# Altium footprint library Tomra_Cadstar_Footprints.PcbLib: 373 footprints (part 4 of 24)
Each footprint in its own frame and in the unit in brackets; x right, y up, seen from the top. Pads: shape width x height; smd on the part's side, far side on the other; paste and mask are expansions set on the pad; w line width, h text height; cw(c..) or ccw(c..) is an arc to the next point about the centre after c.
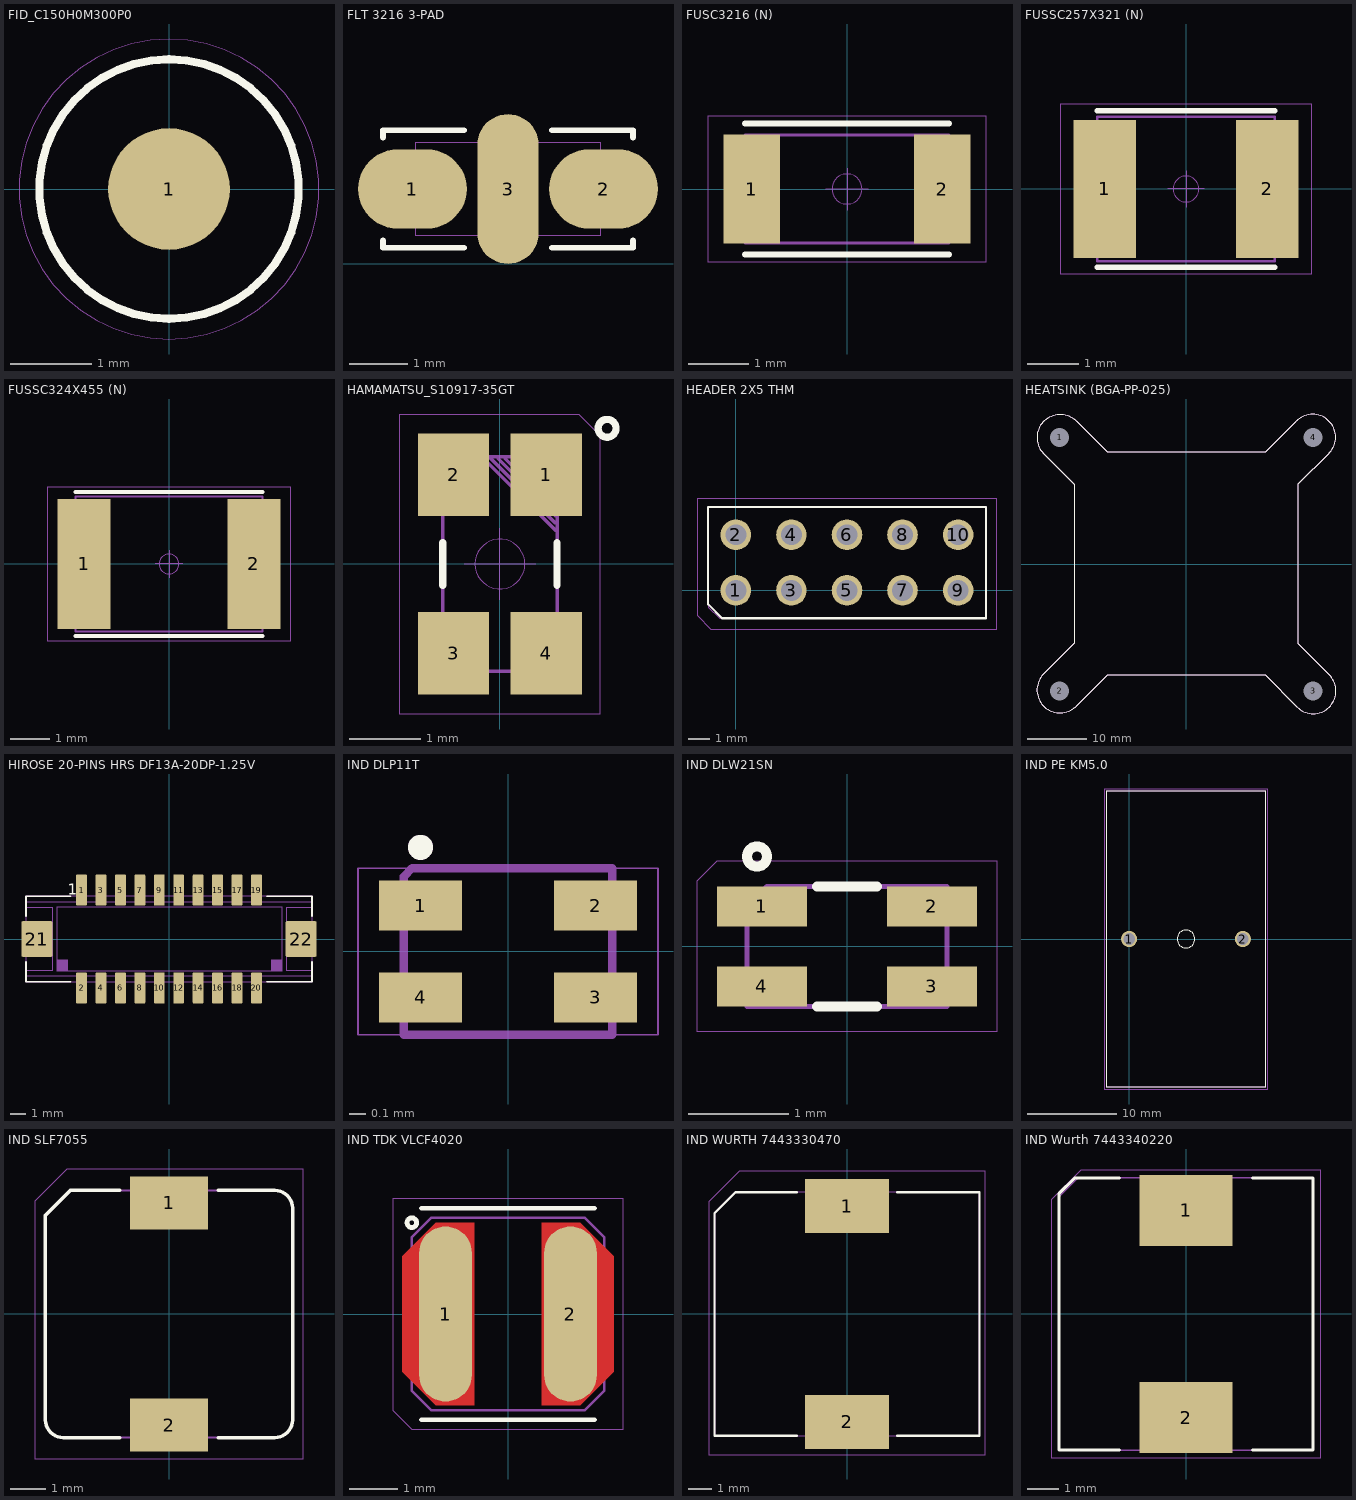
[diagram p3: the footprints below, top view; thin cyan lines are the x and y axes]

## FID_C150H0M300P0 [mm]
pads (1):
  round 1.5 smd paste+0 mask+1.5: 1(0,0)
Top Silk:
  lines w0.1: 0,-1.6 cw(c0,0) 0,1.6 cw(c0,0) 0,-1.6
  text ".Designator" at 0.05,1.85 h0.7
Top Assembly:
  lines w0.05: 0,-1.6 cw(c0,0) 0,1.6 cw(c0,0) 0,-1.6
Top Placement:
  lines w0.01: 0,-1.85 cw(c0,0) 0,1.85 cw(c0,0) 0,-1.85

## FLT 3216 3-PAD [mm]
height 1.6
pads (3):
  oval 1.878x1.37 smd paste+0 mask+0: 1(1.245,1.292) 2(4.547,1.292)
  oval 1.06x2.584 smd paste+0 mask+0: 3(2.896,1.292)
Top Silk:
  lines w0.1: 0.737,0.403 0.737,0.276 2.134,0.276 ; 0.737,2.181 0.737,2.308 2.134,2.308 ; 3.658,0.276 5.055,0.276 5.055,0.403 ; 3.658,2.308 5.055,2.308 5.055,2.181
Top Assembly:
  lines w0.05: 0.737,0.403 0.737,0.276 2.134,0.276 ; 0.737,2.181 0.737,2.308 2.134,2.308 ; 3.658,0.276 5.055,0.276 5.055,0.403 ; 3.658,2.308 5.055,2.308 5.055,2.181
Top Placement:
  lines w0.01: 1.296,0.492 4.496,0.492 4.496,2.092 1.296,2.092 1.296,0.492
  text ".Designator" at -0.703,0.942 h0.7

## FUSC3216 (N) [mm]
height 0.85
pads (2):
  rect 0.94x1.82 smd paste+0 mask+0: 1(-1.59,0) 2(1.59,0)
Top Silk:
  lines w0.1: -1.7,-1.09 1.7,-1.09 ; -1.7,1.09 1.7,1.09
  text ".Designator" at -3.599,-0.35 h0.7
Top Assembly:
  lines w0.05: -1.7,-0.9 -1.7,0.9 1.7,0.9 1.7,-0.9 -1.7,-0.9
Top Placement:
  lines w0.01: -0.35,0 0.35,0 ; 0,-0.35 0,0.35 ; -2.31,-1.22 -2.31,1.22 2.31,1.22 2.31,-1.22 -2.31,-1.22 ; -0.25,0 cw(c0,0) 0.25,0 cw(c0,0) -0.25,0

## FUSSC257X321 (N) [mm]
height 0.85
pads (2):
  rect 1.21x2.67 smd paste+0 mask+0: 1(-1.57,0) 2(1.57,0)
Top Silk:
  lines w0.1: -1.72,-1.515 1.72,-1.515 ; -1.72,1.515 1.72,1.515
  text ".Designator" at -3.599,-0.35 h0.7
Drill:
  lines w0.05: -1.715,-1.4 -1.715,1.4 1.715,1.4 1.715,-1.4 -1.715,-1.4
Top Assembly:
  lines w0.05: -1.72,-1.4 -1.72,1.4 1.72,1.4 1.72,-1.4 -1.72,-1.4
Top Placement:
  lines w0.01: -0.35,0 0.35,0 ; 0,-0.35 0,0.35 ; -2.43,-1.65 -2.43,1.65 2.43,1.65 2.43,-1.65 -2.43,-1.65 ; -0.25,0 cw(c0,0) 0.25,0 cw(c0,0) -0.25,0

## FUSSC324X455 (N) [mm]
height 0.89
pads (2):
  rect 1.34x3.29 smd paste+0 mask+0: 1(-2.15,0) 2(2.15,0)
Top Silk:
  lines w0.1: -2.37,-1.825 2.37,-1.825 ; -2.37,1.825 2.37,1.825
  text ".Designator" at -3.599,-0.35 h0.7
Top Assembly:
  lines w0.05: -2.37,-1.71 -2.37,1.71 2.37,1.71 2.37,-1.71 -2.37,-1.71
Top Placement:
  lines w0.01: -0.35,0 0.35,0 ; 0,-0.35 0,0.35 ; -3.07,-1.96 -3.07,1.96 3.07,1.96 3.07,-1.96 -3.07,-1.96 ; -0.25,0 cw(c0,0) 0.25,0 cw(c0,0) -0.25,0

## HAMAMATSU_S10917-35GT [mm]
height 1
pads (4):
  rect 1x1.15 smd paste+0 mask+0: 1(0.65,1.25) 2(-0.65,1.25) 3(-0.65,-1.25) 4(0.65,-1.25)
Top Silk:
  lines w0.1: -0.8,-0.3 -0.8,0.3 ; 0.8,-0.3 0.8,0.3 ; 1.375,1.9 cw(c1.5,1.9) 1.625,1.9 cw(c1.5,1.9) 1.375,1.9
  text ".Designator" at -3.599,-0.35 h0.7
Top Assembly:
  lines w0.05: -0.225,1.475 0.775,0.475 ; -0.125,1.475 0.775,0.575 ; -0.025,1.475 0.775,0.675 ; 0.075,1.475 0.775,0.775 ; 0.175,1.475 0.775,0.875 ; 0.275,1.475 0.775,0.975 ; 0.375,1.475 0.775,1.075 ; 0.475,1.475 0.775,1.175 ; 0.575,1.475 0.775,1.275 ; 0.675,1.475 0.775,1.375 ; -0.8,-1.5 -0.8,1.5 0.8,1.5 0.8,-1.5 -0.8,-1.5
Top Placement:
  lines w0.01: -0.5,0 0.5,0 ; 0,-0.5 0,0.5 ; -1.4,-2.1 -1.4,2.1 1.1,2.1 1.4,1.8 1.4,-2.1 -1.4,-2.1 ; -0.35,0 cw(c0,0) 0.35,0 cw(c0,0) -0.35,0

## HEADER 2X5 THM [mm]
height 9
pads (10):
  round 1.4 / inner round 1.524 / far side round 1.4 hole 0.95 paste+0 mask+0: 1(0,0) 2(0,2.54) 3(2.54,0) 4(2.54,2.54) 5(5.08,0) 6(5.08,2.54) 7(7.62,0) 8(7.62,2.54) 9(10.16,0) 10(10.16,2.54)
Top Silk:
  lines w0.1: -1.27,-0.635 -0.635,-1.27 11.44,-1.27 11.44,3.81 -1.27,3.81 -1.27,-0.635
  text ".Designator" at -1.27,3.81 h0.7
Top Assembly:
  lines w0.05: -1.27,-0.762 -0.74,-1.27 11.44,-1.27 11.44,3.81 -1.27,3.81 -1.27,-0.762
Top Placement:
  lines w0.01: -1.778,-1.143 -1.143,-1.778 11.94,-1.771 11.94,4.191 -1.778,4.191 -1.778,-1.143

## HEATSINK (BGA-PP-025) [mm]
height 15
pads (4):
  round 1.8 / inner round 1.524 / far side round 1.8 hole 3.2 unplated paste+0 mask+0: 1(-21.213,21.213) 2(-21.213,-21.213) 3(21.213,-21.213) 4(21.213,21.213)
Top Silk:
  lines w0.1: -24,-18.461 ccw(c-21.165,-21.065) -18.561,-23.9 -13.274,-18.613 13.239,-18.613 18.539,-23.913 ccw(c21.231,-21.217) 23.926,-18.526 18.674,-13.274 18.674,13.36 23.8,18.487 ccw(c21.154,21.254) 18.387,23.9 13.274,18.787 -13.247,18.787 -18.474,24.013 ccw(c-21.129,20.96) -23.8,24 ccw(c-21.151,21.201) -23.926,18.526 -18.674,13.274 -18.674,-13.134 -24,-18.461
  text ".Designator" at -12.2,19.9 h0.7
Top Assembly:
  lines w0.05: -24,-18.461 ccw(c-21.165,-21.065) -18.561,-23.9 -13.274,-18.613 13.239,-18.613 18.539,-23.913 ccw(c21.231,-21.217) 23.926,-18.526 18.674,-13.274 18.674,13.36 23.8,18.487 ccw(c21.154,21.254) 18.387,23.9 13.274,18.787 -13.247,18.787 -18.474,24.013 ccw(c-21.129,20.96) -23.8,24 ccw(c-21.151,21.201) -23.926,18.526 -18.674,13.274 -18.674,-13.134 -24,-18.461
Top Placement:
  lines w0.01: -24,-18.461 ccw(c-21.165,-21.065) -18.561,-23.9 -13.274,-18.613 13.239,-18.613 18.539,-23.913 ccw(c21.231,-21.217) 23.926,-18.526 18.674,-13.274 18.674,13.36 23.8,18.487 ccw(c21.154,21.254) 18.387,23.9 13.274,18.787 -13.247,18.787 -18.474,24.013 ccw(c-21.129,20.96) -23.8,24 ccw(c-21.151,21.201) -23.926,18.526 -18.674,13.274 -18.674,-13.134 -24,-18.461

## HIROSE 20-PINS HRS DF13A-20DP-1.25V [mm]
height 4.8
pads (22):
  rrect21% 0.7x2 smd paste+0 mask+0.1: 1(-5.625,3.15) 2(-5.625,-3.15) 3(-4.375,3.15) 4(-4.375,-3.15) 5(-3.125,3.15) 6(-3.125,-3.15) 7(-1.875,3.15) 8(-1.875,-3.15) 9(-0.625,3.15) 10(-0.625,-3.15) 11(0.625,3.15) 12(0.625,-3.15) 13(1.875,3.15) 14(1.875,-3.15) 15(3.125,3.15) 16(3.125,-3.15) 17(4.375,3.15) 18(4.375,-3.15) 19(5.625,3.15) 20(5.625,-3.15)
  rrect10% 2x2.3 smd paste+0 mask+0.1: 21(-8.5,0) 22(8.5,0)
Top Silk:
  lines w0.1: -9.2,-1.45 -9.2,-2.75 -6.325,-2.75 ; -9.2,1.45 -9.2,2.75 -6.325,2.75 ; 6.3,-2.75 9.2,-2.75 9.2,-1.45 ; 6.3,2.75 9.2,2.75 9.2,1.45
  text "1" at -6.525,2.85 h0.7
  text ".Designator" at -6.225,4.55 h0.7
  text ".Comment" at 1.275,4.55 h0.7
Top Assembly:
  region: -7.225,-2.05 -6.525,-2.05 -6.525,-1.35 -7.225,-1.35
  region: 6.575,-2.05 7.275,-2.05 7.275,-1.35 6.575,-1.35
  lines w0.05: -9.2,-2.35 9.2,-2.35 9.2,-2.05 7.575,-2.05 7.575,2.05 9.2,2.05 9.2,2.35 -9.2,2.35 -9.2,2.05 -7.525,2.05 -7.525,-2.05 -9.2,-2.05 -9.2,-2.35 ; -7.225,-2.05 7.275,-2.05 7.275,2.05 -7.225,2.05 -7.225,-2.05
  text "1" at -5.725,0.45 h0.7
  text "20" at 4.975,-1.95 h0.7
Top Placement:
  lines w0.01: -9.2,-2.75 9.2,-2.75 9.2,2.75 -9.2,2.75 -9.2,-2.75

## IND DLP11T [mm]
height 0.35
pads (4):
  rect 0.5x0.3 smd paste+0 mask+0: 1(-0.525,0.275) 2(0.525,0.275) 3(0.525,-0.275) 4(-0.525,-0.275)
Top Silk:
  lines w0.1: -0.525,0.6 cw(c-0.525,0.625) -0.525,0.65 cw(c-0.525,0.625) -0.525,0.6
Drill:
  text ".Designator" at -3.599,0.75 h0.7
Top Assembly:
  lines w0.05: -0.625,-0.5 0.625,-0.5 0.625,0.5 -0.575,0.5 -0.625,0.45 -0.625,-0.5 ; -0.525,0.575 cw(c-0.525,0.625) -0.525,0.675 cw(c-0.525,0.625) -0.525,0.575
Top Placement:
  lines w0.01: -0.9,-0.5 0.9,-0.5 0.9,0.5 -0.9,0.5 -0.9,-0.5

## IND DLW21SN [mm]
height 1.2
pads (4):
  rect 0.9x0.4 smd paste+0 mask+0: 1(-0.85,0.4) 2(0.85,0.4) 3(0.85,-0.4) 4(-0.85,-0.4)
Top Silk:
  lines w0.1: -0.3,-0.6 0.3,-0.6 ; -0.3,0.6 0.3,0.6 ; -0.9,0.8 cw(c-0.9,0.9) -0.9,1 cw(c-0.9,0.9) -0.9,0.8
Drill:
  text ".Designator" at -3.599,-0.35 h0.7
Top Assembly:
  lines w0.05: -1,-0.6 1,-0.6 1,0.6 -0.8,0.6 -1,0.4 -1,-0.6
Top Placement:
  lines w0.01: -1.5,-0.85 1.5,-0.85 1.5,0.85 -1.3,0.85 -1.5,0.65 -1.5,-0.85

## IND PE KM5.0 [mm]
height 35.56
pads (2):
  round 1.8 / inner round 1.524 / far side round 1.8 hole 1.3 paste+0 mask+0: 1(0,0) 2(12.7,0)
Top Silk:
  lines w0.05: 5.35,0 ccw(c6.35,0) 7.35,0 ccw(c6.35,0) 5.35,0
  lines w0.1: -2.54,-16.51 15.24,-16.51 15.24,16.51 -2.54,16.51 -2.54,-16.51
  text ".Designator" at 2.751,-0.35 h0.7
Top Assembly:
  lines w0.05: -2.54,-16.51 15.24,-16.51 15.24,16.51 -2.54,16.51 -2.54,-16.51
Top Placement:
  lines w0.01: -2.79,-16.76 15.49,-16.76 15.49,16.76 -2.79,16.76 -2.79,-16.76

## IND SLF7055 [mm]
height 5.8
pads (2):
  rect 2.2x1.5 smd paste+0 mask+0: 1(0,3.15) 2(0,-3.15)
Top Silk:
  lines w0.1: -1.4,-3.5 -3,-3.5 cw(c-3,-3) -3.5,-3 -3.5,2.8 -2.8,3.5 -1.4,3.5 ; 1.4,-3.5 3,-3.5 ccw(c3,-3) 3.5,-3 3.5,3 ccw(c3,3) 3,3.5 1.4,3.5
  text ".Designator" at -3.599,-0.35 h0.7
Top Assembly:
  lines w0.05: -3.5,-3 ccw(c-3,-3) -3,-3.5 3,-3.5 ccw(c3,-3) 3.5,-3 3.5,3 ccw(c3,3) 3,3.5 -2.8,3.5 -3.5,2.8 -3.5,-3
Top Placement:
  lines w0.01: -3.8,-4.1 3.8,-4.1 3.8,4.1 -2.9,4.1 -3.8,3.2 -3.8,-4.1

## IND TDK VLCF4020 [mm]
height 2
pads (2):
  oval 1.1x3.64 smd paste+0 mask+0: 1(-1.3,0) 2(1.3,0)
Top Elec:
  region: -0.7,1.9 -1.5,1.9 -2.2,1.2 -2.2,-1.2 -1.5,-1.9 -0.7,-1.9
  region: 0.7,-1.9 1.5,-1.9 2.2,-1.2 2.2,1.2 1.5,1.9 0.7,1.9
Top Silk:
  lines w0.1: -1.8,-2.2 1.8,-2.2 ; -1.8,2.2 1.8,2.2 ; -2,1.8 cw(c-2,1.9) -2,2 cw(c-2,1.9) -2,1.8
  text ".Designator" at 0.35,-3.599 h0.7
Top Paste:
  region: -0.7,1.9 -1.5,1.9 -2.2,1.2 -2.2,-1.2 -1.5,-1.9 -0.7,-1.9
  region: 0.7,-1.9 1.5,-1.9 2.2,-1.2 2.2,1.2 1.5,1.9 0.7,1.9
Top Solder Resist:
  region: -0.7,1.9 -1.5,1.9 -2.2,1.2 -2.2,-1.2 -1.5,-1.9 -0.7,-1.9
  region: 0.7,-1.9 1.5,-1.9 2.2,-1.2 2.2,1.2 1.5,1.9 0.7,1.9
Top Assembly:
  lines w0.05: -2,-1.6 -1.6,-2 1.6,-2 2,-1.6 2,1.6 1.6,2 -1.6,2 -2,1.6 -2,-1.6
Top Placement:
  lines w0.01: -2.4,-2 -2,-2.4 2.4,-2.4 2.4,2.4 -2.4,2.4 -2.4,-2

## IND WURTH 7443330470 [mm]
height 9.7
pads (2):
  rect 3.6x2.3 smd paste+0 mask+0: 1(0,4.6) 2(0,-4.6)
Top Silk:
  lines w0.1: -2.15,-5.2 -5.65,-5.2 -5.65,4.3 -4.75,5.2 -2.15,5.2 ; 2.15,-5.2 5.65,-5.2 5.65,5.2 2.15,5.2
Top Assembly:
  lines w0.05: -5.65,-5.2 5.65,-5.2 5.65,5.2 -4.8,5.2 -5.65,4.35 -5.65,-5.2
Top Placement:
  lines w0.01: -5.9,-6 5.9,-6 5.9,6.1 -4.6,6.1 -5.9,4.8 -5.9,-6
  lines w0.05: 1.462,-3.653 1.463,-3.655 1.464,-3.655 1.464,-3.654 1.463,-3.654 1.462,-3.653

## IND Wurth 7443340220 [mm]
height 7.5
pads (2):
  rect 3x2.3 smd paste+0 mask+0: 1(0,3.35) 2(0,-3.35)
Top Silk:
  lines w0.1: -2.15,-4.4 -4.1,-4.4 -4.1,3.9 -3.6,4.4 -2.15,4.4 ; 2.15,-4.4 4.1,-4.4 4.1,4.4 2.15,4.4
  text ".Designator" at -3.599,-0.35 h0.7
Top Assembly:
  lines w0.05: -4.1,-4.4 4.1,-4.4 4.1,4.4 -3.5,4.4 -4.1,3.8 -4.1,-4.4
Top Placement:
  lines w0.01: -4.35,-4.65 4.35,-4.65 4.35,4.65 -3.4,4.65 -4.35,3.7 -4.35,-4.65
  lines w0.05: 1.462,-3.653 1.463,-3.655 1.464,-3.655 1.464,-3.654 1.463,-3.654 1.462,-3.653